# Altium footprint library ref-packages.PCBLIB: 1544 footprints (part 71 of 103) (continued)
## SQFP-R-07X10-60 [mil]
pads (60):
  rect 11.81x62.99 smd: 1(-167.32,-161.42) 2(-147.64,-161.42) 3(-127.95,-161.42) 4(-108.27,-161.42) 5(-88.58,-161.42) 6(-68.9,-161.42) 7(-49.21,-161.42) 8(-29.53,-161.42) 9(-9.84,-161.42) 10(9.84,-161.42) 11(29.53,-161.42) 12(49.21,-161.42) 13(68.9,-161.42) 14(88.58,-161.42) 15(108.27,-161.42) 16(127.95,-161.42) 17(147.64,-161.42) 18(167.32,-161.42) 31(167.32,161.42) 32(147.64,161.42) 33(127.95,161.42) 34(108.27,161.42) 35(88.58,161.42) 36(68.9,161.42) 37(49.21,161.42) 38(29.53,161.42) 39(9.84,161.42) 40(-9.84,161.42) 41(-29.53,161.42) 42(-49.21,161.42) 43(-68.9,161.42) 44(-88.58,161.42) 45(-108.27,161.42) 46(-127.95,161.42) 47(-147.64,161.42) 48(-167.32,161.42)
  rect 62.99x11.81 smd: 19(220.47,-108.27) 20(220.47,-88.58) 21(220.47,-68.9) 22(220.47,-49.21) 23(220.47,-29.53) 24(220.47,-9.84) 25(220.47,9.84) 26(220.47,29.53) 27(220.47,49.21) 28(220.47,68.9) 29(220.47,88.58) 30(220.47,108.27) 49(-220.47,108.27) 50(-220.47,88.58) 51(-220.47,68.9) 52(-220.47,49.21) 53(-220.47,29.53) 54(-220.47,9.84) 55(-220.47,-9.84) 56(-220.47,-29.53) 57(-220.47,-49.21) 58(-220.47,-68.9) 59(-220.47,-88.58) 60(-220.47,-108.27)
Top Overlay:
  circle w10: c-137.8,-78.74 r29.53
  lines w8: -179.92,-120.47 179.53,-120.47 179.53,120.47 -179.92,120.47 -179.92,-120.47
Mechanical 16:
  rectangle: -173.23,-181.1 -161.42,-135.83
  rectangle: 194.88,-114.17 240.16,-102.36
  rectangle: -153.54,-181.1 -141.73,-135.83
  rectangle: -133.86,-181.1 -122.05,-135.83
  rectangle: -114.17,-181.1 -102.36,-135.83
  rectangle: -94.49,-181.1 -82.68,-135.83
  rectangle: -74.8,-181.1 -62.99,-135.83
  rectangle: -55.12,-181.1 -43.31,-135.83
  rectangle: -35.43,-181.1 -23.62,-135.83
  rectangle: -15.75,-181.1 -3.94,-135.83
  rectangle: 3.94,-181.1 15.75,-135.83
  rectangle: 23.62,-181.1 35.43,-135.83
  rectangle: 43.31,-181.1 55.12,-135.83
  rectangle: 62.99,-181.1 74.8,-135.83
  rectangle: 82.68,-181.1 94.49,-135.83
  rectangle: 102.36,-181.1 114.17,-135.83
  rectangle: 122.05,-181.1 133.86,-135.83
  rectangle: 141.73,-181.1 153.54,-135.83
  rectangle: 161.42,-181.1 173.23,-135.83
  rectangle: 194.88,-94.49 240.16,-82.68
  rectangle: 194.88,-74.8 240.16,-62.99
  rectangle: 194.88,-55.12 240.16,-43.31
  rectangle: 194.88,-35.43 240.16,-23.62
  rectangle: 194.88,-15.75 240.16,-3.94
  rectangle: 194.88,3.94 240.16,15.75
  rectangle: 194.88,23.62 240.16,35.43
  rectangle: 194.88,43.31 240.16,55.12
  rectangle: 194.88,62.99 240.16,74.8
  rectangle: 194.88,82.68 240.16,94.49
  rectangle: 194.88,102.36 240.16,114.17
  rectangle: 161.42,135.83 173.23,181.1
  rectangle: 141.73,135.83 153.54,181.1
  rectangle: 122.05,135.83 133.86,181.1
  rectangle: 102.36,135.83 114.17,181.1
  rectangle: 82.68,135.83 94.49,181.1
  rectangle: 62.99,135.83 74.8,181.1
  rectangle: 43.31,135.83 55.12,181.1
  rectangle: 23.62,135.83 35.43,181.1
  rectangle: 3.94,135.83 15.75,181.1
  rectangle: -15.75,135.83 -3.94,181.1
  rectangle: -35.43,135.83 -23.62,181.1
  rectangle: -55.12,135.83 -43.31,181.1
  rectangle: -74.8,135.83 -62.99,181.1
  rectangle: -94.49,135.83 -82.68,181.1
  rectangle: -114.17,135.83 -102.36,181.1
  rectangle: -133.86,135.83 -122.05,181.1
  rectangle: -153.54,135.83 -141.73,181.1
  rectangle: -173.23,135.83 -161.42,181.1
  rectangle: -240.16,102.36 -194.88,114.17
  rectangle: -240.16,82.68 -194.88,94.49
  rectangle: -240.16,62.99 -194.88,74.8
  rectangle: -240.16,43.31 -194.88,55.12
  rectangle: -240.16,23.62 -194.88,35.43
  rectangle: -240.16,3.94 -194.88,15.75
  rectangle: -240.16,-15.75 -194.88,-3.94
  rectangle: -240.16,-35.43 -194.88,-23.62
  rectangle: -240.16,-55.12 -194.88,-43.31
  rectangle: -240.16,-74.8 -194.88,-62.99
  rectangle: -240.16,-94.49 -194.88,-82.68
  rectangle: -240.16,-114.17 -194.88,-102.36
  lines w8: -192.91,-133.86 192.91,-133.86 192.91,133.86 -192.91,133.86 -192.91,-133.86
Mechanical 27:
  lines w7.87: -271.65,-212.6 -271.65,212.6 271.65,212.6 271.65,-212.6 -271.65,-212.6

## SQFP-R-07X10-68 [mm]
pads (68):
  rect 0.25x1.6 smd: 1(-3.8,-4.1) 2(-3.4,-4.1) 3(-3,-4.1) 4(-2.6,-4.1) 5(-2.2,-4.1) 6(-1.8,-4.1) 7(-1.4,-4.1) 8(-1,-4.1) 9(-0.6,-4.1) 10(-0.2,-4.1) 11(0.2,-4.1) 12(0.6,-4.1) 13(1,-4.1) 14(1.4,-4.1) 15(1.8,-4.1) 16(2.2,-4.1) 17(2.6,-4.1) 18(3,-4.1) 19(3.4,-4.1) 20(3.8,-4.1) 35(3.8,4.1) 36(3.4,4.1) 37(3,4.1) 38(2.6,4.1) 39(2.2,4.1) 40(1.8,4.1) 41(1.4,4.1) 42(1,4.1) 43(0.6,4.1) 44(0.2,4.1) 45(-0.2,4.1) 46(-0.6,4.1) 47(-1,4.1) 48(-1.4,4.1) 49(-1.8,4.1) 50(-2.2,4.1) 51(-2.6,4.1) 52(-3,4.1) 53(-3.4,4.1) 54(-3.8,4.1)
  rect 1.6x0.25 smd: 21(5.6,-2.6) 22(5.6,-2.2) 23(5.6,-1.8) 24(5.6,-1.4) 25(5.6,-1) 26(5.6,-0.6) 27(5.6,-0.2) 28(5.6,0.2) 29(5.6,0.6) 30(5.6,1) 31(5.6,1.4) 32(5.6,1.8) 33(5.6,2.2) 34(5.6,2.6) 55(-5.6,2.6) 56(-5.6,2.2) 57(-5.6,1.8) 58(-5.6,1.4) 59(-5.6,1) 60(-5.6,0.6) 61(-5.6,0.2) 62(-5.6,-0.2) 63(-5.6,-0.6) 64(-5.6,-1) 65(-5.6,-1.4) 66(-5.6,-1.8) 67(-5.6,-2.2) 68(-5.6,-2.6)
Top Overlay:
  circle w0.254: c-3.5,-2 r0.75
  lines w0.203: -4.57,-3.06 4.56,-3.06 4.56,3.06 -4.57,3.06 -4.57,-3.06
Mechanical 16:
  rectangle: -3.91,-4.6 -3.69,-3.45
  rectangle: 4.95,-2.71 6.1,-2.49
  rectangle: -3.51,-4.6 -3.29,-3.45
  rectangle: -3.11,-4.6 -2.89,-3.45
  rectangle: -2.71,-4.6 -2.49,-3.45
  rectangle: -2.31,-4.6 -2.09,-3.45
  rectangle: -1.91,-4.6 -1.69,-3.45
  rectangle: -1.51,-4.6 -1.29,-3.45
  rectangle: -1.11,-4.6 -0.89,-3.45
  rectangle: -0.71,-4.6 -0.49,-3.45
  rectangle: -0.31,-4.6 -0.09,-3.45
  rectangle: 0.09,-4.6 0.31,-3.45
  rectangle: 0.49,-4.6 0.71,-3.45
  rectangle: 0.89,-4.6 1.11,-3.45
  rectangle: 1.29,-4.6 1.51,-3.45
  rectangle: 1.69,-4.6 1.91,-3.45
  rectangle: 2.09,-4.6 2.31,-3.45
  rectangle: 2.49,-4.6 2.71,-3.45
  rectangle: 2.89,-4.6 3.11,-3.45
  rectangle: 3.29,-4.6 3.51,-3.45
  rectangle: 3.69,-4.6 3.91,-3.45
  rectangle: 4.95,-2.31 6.1,-2.09
  rectangle: 4.95,-1.91 6.1,-1.69
  rectangle: 4.95,-1.51 6.1,-1.29
  rectangle: 4.95,-1.11 6.1,-0.89
  rectangle: 4.95,-0.71 6.1,-0.49
  rectangle: 4.95,-0.31 6.1,-0.09
  rectangle: 4.95,0.09 6.1,0.31
  rectangle: 4.95,0.49 6.1,0.71
  rectangle: 4.95,0.89 6.1,1.11
  rectangle: 4.95,1.29 6.1,1.51
  rectangle: 4.95,1.69 6.1,1.91
  rectangle: 4.95,2.09 6.1,2.31
  rectangle: 4.95,2.49 6.1,2.71
  rectangle: 3.69,3.45 3.91,4.6
  rectangle: 3.29,3.45 3.51,4.6
  rectangle: 2.89,3.45 3.11,4.6
  rectangle: 2.49,3.45 2.71,4.6
  rectangle: 2.09,3.45 2.31,4.6
  rectangle: 1.69,3.45 1.91,4.6
  rectangle: 1.29,3.45 1.51,4.6
  rectangle: 0.89,3.45 1.11,4.6
  rectangle: 0.49,3.45 0.71,4.6
  rectangle: 0.09,3.45 0.31,4.6
  rectangle: -0.31,3.45 -0.09,4.6
  rectangle: -0.71,3.45 -0.49,4.6
  rectangle: -1.11,3.45 -0.89,4.6
  rectangle: -1.51,3.45 -1.29,4.6
  rectangle: -1.91,3.45 -1.69,4.6
  rectangle: -2.31,3.45 -2.09,4.6
  rectangle: -2.71,3.45 -2.49,4.6
  rectangle: -3.11,3.45 -2.89,4.6
  rectangle: -3.51,3.45 -3.29,4.6
  rectangle: -3.91,3.45 -3.69,4.6
  rectangle: -6.1,2.49 -4.95,2.71
  rectangle: -6.1,2.09 -4.95,2.31
  rectangle: -6.1,1.69 -4.95,1.91
  rectangle: -6.1,1.29 -4.95,1.51
  rectangle: -6.1,0.89 -4.95,1.11
  rectangle: -6.1,0.49 -4.95,0.71
  rectangle: -6.1,0.09 -4.95,0.31
  rectangle: -6.1,-0.31 -4.95,-0.09
  rectangle: -6.1,-0.71 -4.95,-0.49
  rectangle: -6.1,-1.11 -4.95,-0.89
  rectangle: -6.1,-1.51 -4.95,-1.29
  rectangle: -6.1,-1.91 -4.95,-1.69
  rectangle: -6.1,-2.31 -4.95,-2.09
  rectangle: -6.1,-2.71 -4.95,-2.49
  lines w0.203: -4.9,-3.4 4.9,-3.4 4.9,3.4 -4.9,3.4 -4.9,-3.4
Mechanical 27:
  lines w0.2: -6.9,-5.4 -6.9,5.4 6.9,5.4 6.9,-5.4 -6.9,-5.4

## SQFP-R-07X10-76 [mm]
pads (76):
  rect 0.25x1.6 smd: 1(-4.2,-4.1) 2(-3.8,-4.1) 3(-3.4,-4.1) 4(-3,-4.1) 5(-2.6,-4.1) 6(-2.2,-4.1) 7(-1.8,-4.1) 8(-1.4,-4.1) 9(-1,-4.1) 10(-0.6,-4.1) 11(-0.2,-4.1) 12(0.2,-4.1) 13(0.6,-4.1) 14(1,-4.1) 15(1.4,-4.1) 16(1.8,-4.1) 17(2.2,-4.1) 18(2.6,-4.1) 19(3,-4.1) 20(3.4,-4.1) 21(3.8,-4.1) 22(4.2,-4.1) 39(4.2,4.1) 40(3.8,4.1) 41(3.4,4.1) 42(3,4.1) 43(2.6,4.1) 44(2.2,4.1) 45(1.8,4.1) 46(1.4,4.1) 47(1,4.1) 48(0.6,4.1) 49(0.2,4.1) 50(-0.2,4.1) 51(-0.6,4.1) 52(-1,4.1) 53(-1.4,4.1) 54(-1.8,4.1) 55(-2.2,4.1) 56(-2.6,4.1) 57(-3,4.1) 58(-3.4,4.1) 59(-3.8,4.1) 60(-4.2,4.1)
  rect 1.6x0.25 smd: 23(5.6,-3) 24(5.6,-2.6) 25(5.6,-2.2) 26(5.6,-1.8) 27(5.6,-1.4) 28(5.6,-1) 29(5.6,-0.6) 30(5.6,-0.2) 31(5.6,0.2) 32(5.6,0.6) 33(5.6,1) 34(5.6,1.4) 35(5.6,1.8) 36(5.6,2.2) 37(5.6,2.6) 38(5.6,3) 61(-5.6,3) 62(-5.6,2.6) 63(-5.6,2.2) 64(-5.6,1.8) 65(-5.6,1.4) 66(-5.6,1) 67(-5.6,0.6) 68(-5.6,0.2) 69(-5.6,-0.2) 70(-5.6,-0.6) 71(-5.6,-1) 72(-5.6,-1.4) 73(-5.6,-1.8) 74(-5.6,-2.2) 75(-5.6,-2.6) 76(-5.6,-3)
Top Overlay:
  circle w0.254: c-3.5,-2 r0.75
  lines w0.203: -4.57,-3.06 4.56,-3.06 4.56,3.06 -4.57,3.06 -4.57,-3.06
Mechanical 16:
  rectangle: -4.31,-4.6 -4.09,-3.45
  rectangle: 4.95,-3.11 6.1,-2.89
  rectangle: -3.91,-4.6 -3.69,-3.45
  rectangle: -3.51,-4.6 -3.29,-3.45
  rectangle: -3.11,-4.6 -2.89,-3.45
  rectangle: -2.71,-4.6 -2.49,-3.45
  rectangle: -2.31,-4.6 -2.09,-3.45
  rectangle: -1.91,-4.6 -1.69,-3.45
  rectangle: -1.51,-4.6 -1.29,-3.45
  rectangle: -1.11,-4.6 -0.89,-3.45
  rectangle: -0.71,-4.6 -0.49,-3.45
  rectangle: -0.31,-4.6 -0.09,-3.45
  rectangle: 0.09,-4.6 0.31,-3.45
  rectangle: 0.49,-4.6 0.71,-3.45
  rectangle: 0.89,-4.6 1.11,-3.45
  rectangle: 1.29,-4.6 1.51,-3.45
  rectangle: 1.69,-4.6 1.91,-3.45
  rectangle: 2.09,-4.6 2.31,-3.45
  rectangle: 2.49,-4.6 2.71,-3.45
  rectangle: 2.89,-4.6 3.11,-3.45
  rectangle: 3.29,-4.6 3.51,-3.45
  rectangle: 3.69,-4.6 3.91,-3.45
  rectangle: 4.09,-4.6 4.31,-3.45
  rectangle: 4.95,-2.71 6.1,-2.49
  rectangle: 4.95,-2.31 6.1,-2.09
  rectangle: 4.95,-1.91 6.1,-1.69
  rectangle: 4.95,-1.51 6.1,-1.29
  rectangle: 4.95,-1.11 6.1,-0.89
  rectangle: 4.95,-0.71 6.1,-0.49
  rectangle: 4.95,-0.31 6.1,-0.09
  rectangle: 4.95,0.09 6.1,0.31
  rectangle: 4.95,0.49 6.1,0.71
  rectangle: 4.95,0.89 6.1,1.11
  rectangle: 4.95,1.29 6.1,1.51
  rectangle: 4.95,1.69 6.1,1.91
  rectangle: 4.95,2.09 6.1,2.31
  rectangle: 4.95,2.49 6.1,2.71
  rectangle: 4.95,2.89 6.1,3.11
  rectangle: 4.09,3.45 4.31,4.6
  rectangle: 3.69,3.45 3.91,4.6
  rectangle: 3.29,3.45 3.51,4.6
  rectangle: 2.89,3.45 3.11,4.6
  rectangle: 2.49,3.45 2.71,4.6
  rectangle: 2.09,3.45 2.31,4.6
  rectangle: 1.69,3.45 1.91,4.6
  rectangle: 1.29,3.45 1.51,4.6
  rectangle: 0.89,3.45 1.11,4.6
  rectangle: 0.49,3.45 0.71,4.6
  rectangle: 0.09,3.45 0.31,4.6
  rectangle: -0.31,3.45 -0.09,4.6
  rectangle: -0.71,3.45 -0.49,4.6
  rectangle: -1.11,3.45 -0.89,4.6
  rectangle: -1.51,3.45 -1.29,4.6
  rectangle: -1.91,3.45 -1.69,4.6
  rectangle: -2.31,3.45 -2.09,4.6
  rectangle: -2.71,3.45 -2.49,4.6
  rectangle: -3.11,3.45 -2.89,4.6
  rectangle: -3.51,3.45 -3.29,4.6
  rectangle: -3.91,3.45 -3.69,4.6
  rectangle: -4.31,3.45 -4.09,4.6
  rectangle: -6.1,2.89 -4.95,3.11
  rectangle: -6.1,2.49 -4.95,2.71
  rectangle: -6.1,2.09 -4.95,2.31
  rectangle: -6.1,1.69 -4.95,1.91
  rectangle: -6.1,1.29 -4.95,1.51
  rectangle: -6.1,0.89 -4.95,1.11
  rectangle: -6.1,0.49 -4.95,0.71
  rectangle: -6.1,0.09 -4.95,0.31
  rectangle: -6.1,-0.31 -4.95,-0.09
  rectangle: -6.1,-0.71 -4.95,-0.49
  rectangle: -6.1,-1.11 -4.95,-0.89
  rectangle: -6.1,-1.51 -4.95,-1.29
  rectangle: -6.1,-1.91 -4.95,-1.69
  rectangle: -6.1,-2.31 -4.95,-2.09
  rectangle: -6.1,-2.71 -4.95,-2.49
  rectangle: -6.1,-3.11 -4.95,-2.89
  lines w0.203: -4.9,-3.4 4.9,-3.4 4.9,3.4 -4.9,3.4 -4.9,-3.4
Mechanical 27:
  lines w0.2: -6.9,-5.4 -6.9,5.4 6.9,5.4 6.9,-5.4 -6.9,-5.4

## SQFP-R-07X10-92 [mm]
pads (92):
  rect 0.17x1.6 smd: 1(-4.05,-4.1) 2(-3.75,-4.1) 3(-3.45,-4.1) 4(-3.15,-4.1) 5(-2.85,-4.1) 6(-2.55,-4.1) 7(-2.25,-4.1) 8(-1.95,-4.1) 9(-1.65,-4.1) 10(-1.35,-4.1) 11(-1.05,-4.1) 12(-0.75,-4.1) 13(-0.45,-4.1) 14(-0.15,-4.1) 15(0.15,-4.1) 16(0.45,-4.1) 17(0.75,-4.1) 18(1.05,-4.1) 19(1.35,-4.1) 20(1.65,-4.1) 21(1.95,-4.1) 22(2.25,-4.1) 23(2.55,-4.1) 24(2.85,-4.1) 25(3.15,-4.1) 26(3.45,-4.1) 27(3.75,-4.1) 28(4.05,-4.1) 47(4.05,4.1) 48(3.75,4.1) 49(3.45,4.1) 50(3.15,4.1) 51(2.85,4.1) 52(2.55,4.1) 53(2.25,4.1) 54(1.95,4.1) 55(1.65,4.1) 56(1.35,4.1) 57(1.05,4.1) 58(0.75,4.1) 59(0.45,4.1) 60(0.15,4.1) 61(-0.15,4.1) 62(-0.45,4.1) 63(-0.75,4.1) 64(-1.05,4.1) 65(-1.35,4.1) 66(-1.65,4.1) 67(-1.95,4.1) 68(-2.25,4.1) 69(-2.55,4.1) 70(-2.85,4.1) 71(-3.15,4.1) 72(-3.45,4.1) 73(-3.75,4.1) 74(-4.05,4.1)
  rect 1.6x0.17 smd: 29(5.6,-2.55) 30(5.6,-2.25) 31(5.6,-1.95) 32(5.6,-1.65) 33(5.6,-1.35) 34(5.6,-1.05) 35(5.6,-0.75) 36(5.6,-0.45) 37(5.6,-0.15) 38(5.6,0.15) 39(5.6,0.45) 40(5.6,0.75) 41(5.6,1.05) 42(5.6,1.35) 43(5.6,1.65) 44(5.6,1.95) 45(5.6,2.25) 46(5.6,2.55) 75(-5.6,2.55) 76(-5.6,2.25) 77(-5.6,1.95) 78(-5.6,1.65) 79(-5.6,1.35) 80(-5.6,1.05) 81(-5.6,0.75) 82(-5.6,0.45) 83(-5.6,0.15) 84(-5.6,-0.15) 85(-5.6,-0.45) 86(-5.6,-0.75) 87(-5.6,-1.05) 88(-5.6,-1.35) 89(-5.6,-1.65) 90(-5.6,-1.95) 91(-5.6,-2.25) 92(-5.6,-2.55)
Top Overlay:
  circle w0.254: c-3.5,-2 r0.75
  lines w0.203: -4.57,-3.06 4.56,-3.06 4.56,3.06 -4.57,3.06 -4.57,-3.06
Mechanical 16:
  rectangle: -4.12,-4.6 -3.98,-3.45
  rectangle: 4.95,-2.62 6.1,-2.48
  rectangle: -3.82,-4.6 -3.68,-3.45
  rectangle: -3.52,-4.6 -3.38,-3.45
  rectangle: -3.22,-4.6 -3.08,-3.45
  rectangle: -2.92,-4.6 -2.78,-3.45
  rectangle: -2.62,-4.6 -2.48,-3.45
  rectangle: -2.32,-4.6 -2.18,-3.45
  rectangle: -2.02,-4.6 -1.88,-3.45
  rectangle: -1.72,-4.6 -1.58,-3.45
  rectangle: -1.42,-4.6 -1.28,-3.45
  rectangle: -1.12,-4.6 -0.98,-3.45
  rectangle: -0.82,-4.6 -0.68,-3.45
  rectangle: -0.52,-4.6 -0.38,-3.45
  rectangle: -0.22,-4.6 -0.08,-3.45
  rectangle: 0.08,-4.6 0.22,-3.45
  rectangle: 0.38,-4.6 0.52,-3.45
  rectangle: 0.68,-4.6 0.82,-3.45
  rectangle: 0.98,-4.6 1.12,-3.45
  rectangle: 1.28,-4.6 1.42,-3.45
  rectangle: 1.58,-4.6 1.72,-3.45
  rectangle: 1.88,-4.6 2.02,-3.45
  rectangle: 2.18,-4.6 2.32,-3.45
  rectangle: 2.48,-4.6 2.62,-3.45
  rectangle: 2.78,-4.6 2.92,-3.45
  rectangle: 3.08,-4.6 3.22,-3.45
  rectangle: 3.38,-4.6 3.52,-3.45
  rectangle: 3.68,-4.6 3.82,-3.45
  rectangle: 3.98,-4.6 4.12,-3.45
  rectangle: 4.95,-2.32 6.1,-2.18
  rectangle: 4.95,-2.02 6.1,-1.88
  rectangle: 4.95,-1.72 6.1,-1.58
  rectangle: 4.95,-1.42 6.1,-1.28
  rectangle: 4.95,-1.12 6.1,-0.98
  rectangle: 4.95,-0.82 6.1,-0.68
  rectangle: 4.95,-0.52 6.1,-0.38
  rectangle: 4.95,-0.22 6.1,-0.08
  rectangle: 4.95,0.08 6.1,0.22
  rectangle: 4.95,0.38 6.1,0.52
  rectangle: 4.95,0.68 6.1,0.82
  rectangle: 4.95,0.98 6.1,1.12
  rectangle: 4.95,1.28 6.1,1.42
  rectangle: 4.95,1.58 6.1,1.72
  rectangle: 4.95,1.88 6.1,2.02
  rectangle: 4.95,2.18 6.1,2.32
  rectangle: 4.95,2.48 6.1,2.62
  rectangle: 3.98,3.45 4.12,4.6
  rectangle: 3.68,3.45 3.82,4.6
  rectangle: 3.38,3.45 3.52,4.6
  rectangle: 3.08,3.45 3.22,4.6
  rectangle: 2.78,3.45 2.92,4.6
  rectangle: 2.48,3.45 2.62,4.6
  rectangle: 2.18,3.45 2.32,4.6
  rectangle: 1.88,3.45 2.02,4.6
  rectangle: 1.58,3.45 1.72,4.6
  rectangle: 1.28,3.45 1.42,4.6
  rectangle: 0.98,3.45 1.12,4.6
  rectangle: 0.68,3.45 0.82,4.6
  rectangle: 0.38,3.45 0.52,4.6
  rectangle: 0.08,3.45 0.22,4.6
  rectangle: -0.22,3.45 -0.08,4.6
  rectangle: -0.52,3.45 -0.38,4.6
  rectangle: -0.82,3.45 -0.68,4.6
  rectangle: -1.12,3.45 -0.98,4.6
  rectangle: -1.42,3.45 -1.28,4.6
  rectangle: -1.72,3.45 -1.58,4.6
  rectangle: -2.02,3.45 -1.88,4.6
  rectangle: -2.32,3.45 -2.18,4.6
  rectangle: -2.62,3.45 -2.48,4.6
  rectangle: -2.92,3.45 -2.78,4.6
  rectangle: -3.22,3.45 -3.08,4.6
  rectangle: -3.52,3.45 -3.38,4.6
  rectangle: -3.82,3.45 -3.68,4.6
  rectangle: -4.12,3.45 -3.98,4.6
  rectangle: -6.1,2.48 -4.95,2.62
  rectangle: -6.1,2.18 -4.95,2.32
  rectangle: -6.1,1.88 -4.95,2.02
  rectangle: -6.1,1.58 -4.95,1.72
  rectangle: -6.1,1.28 -4.95,1.42
  rectangle: -6.1,0.98 -4.95,1.12
  rectangle: -6.1,0.68 -4.95,0.82
  rectangle: -6.1,0.38 -4.95,0.52
  rectangle: -6.1,0.08 -4.95,0.22
  rectangle: -6.1,-0.22 -4.95,-0.08
  rectangle: -6.1,-0.52 -4.95,-0.38
  rectangle: -6.1,-0.82 -4.95,-0.68
  rectangle: -6.1,-1.12 -4.95,-0.98
  rectangle: -6.1,-1.42 -4.95,-1.28
  rectangle: -6.1,-1.72 -4.95,-1.58
  rectangle: -6.1,-2.02 -4.95,-1.88
  rectangle: -6.1,-2.32 -4.95,-2.18
  rectangle: -6.1,-2.62 -4.95,-2.48
  lines w0.203: -4.9,-3.4 4.9,-3.4 4.9,3.4 -4.9,3.4 -4.9,-3.4
Mechanical 27:
  lines w0.2: -6.9,-5.4 -6.9,5.4 6.9,5.4 6.9,-5.4 -6.9,-5.4

## SQFP-R-07X10-100 [mm]
pads (100):
  rect 0.17x1.6 smd: 1(-4.35,-4.1) 2(-4.05,-4.1) 3(-3.75,-4.1) 4(-3.45,-4.1) 5(-3.15,-4.1) 6(-2.85,-4.1) 7(-2.55,-4.1) 8(-2.25,-4.1) 9(-1.95,-4.1) 10(-1.65,-4.1) 11(-1.35,-4.1) 12(-1.05,-4.1) 13(-0.75,-4.1) 14(-0.45,-4.1) 15(-0.15,-4.1) 16(0.15,-4.1) 17(0.45,-4.1) 18(0.75,-4.1) 19(1.05,-4.1) 20(1.35,-4.1) 21(1.65,-4.1) 22(1.95,-4.1) 23(2.25,-4.1) 24(2.55,-4.1) 25(2.85,-4.1) 26(3.15,-4.1) 27(3.45,-4.1) 28(3.75,-4.1) 29(4.05,-4.1) 30(4.35,-4.1) 51(4.35,4.1) 52(4.05,4.1) 53(3.75,4.1) 54(3.45,4.1) 55(3.15,4.1) 56(2.85,4.1) 57(2.55,4.1) 58(2.25,4.1) 59(1.95,4.1) 60(1.65,4.1) 61(1.35,4.1) 62(1.05,4.1) 63(0.75,4.1) 64(0.45,4.1) 65(0.15,4.1) 66(-0.15,4.1) 67(-0.45,4.1) 68(-0.75,4.1) 69(-1.05,4.1) 70(-1.35,4.1) 71(-1.65,4.1) 72(-1.95,4.1) 73(-2.25,4.1) 74(-2.55,4.1) 75(-2.85,4.1) 76(-3.15,4.1) 77(-3.45,4.1) 78(-3.75,4.1) 79(-4.05,4.1) 80(-4.35,4.1)
  rect 1.6x0.17 smd: 31(5.6,-2.85) 32(5.6,-2.55) 33(5.6,-2.25) 34(5.6,-1.95) 35(5.6,-1.65) 36(5.6,-1.35) 37(5.6,-1.05) 38(5.6,-0.75) 39(5.6,-0.45) 40(5.6,-0.15) 41(5.6,0.15) 42(5.6,0.45) 43(5.6,0.75) 44(5.6,1.05) 45(5.6,1.35) 46(5.6,1.65) 47(5.6,1.95) 48(5.6,2.25) 49(5.6,2.55) 50(5.6,2.85) 81(-5.6,2.85) 82(-5.6,2.55) 83(-5.6,2.25) 84(-5.6,1.95) 85(-5.6,1.65) 86(-5.6,1.35) 87(-5.6,1.05) 88(-5.6,0.75) 89(-5.6,0.45) 90(-5.6,0.15) 91(-5.6,-0.15) 92(-5.6,-0.45) 93(-5.6,-0.75) 94(-5.6,-1.05) 95(-5.6,-1.35) 96(-5.6,-1.65) 97(-5.6,-1.95) 98(-5.6,-2.25) 99(-5.6,-2.55) 100(-5.6,-2.85)
Top Overlay:
  circle w0.254: c-3.5,-2 r0.75
  lines w0.203: -4.57,-3.06 4.56,-3.06 4.56,3.06 -4.57,3.06 -4.57,-3.06
Mechanical 16:
  rectangle: -4.42,-4.6 -4.28,-3.45
  rectangle: 4.95,-2.92 6.1,-2.78
  rectangle: -4.12,-4.6 -3.98,-3.45
  rectangle: -3.82,-4.6 -3.68,-3.45
  rectangle: -3.52,-4.6 -3.38,-3.45
  rectangle: -3.22,-4.6 -3.08,-3.45
  rectangle: -2.92,-4.6 -2.78,-3.45
  rectangle: -2.62,-4.6 -2.48,-3.45
  rectangle: -2.32,-4.6 -2.18,-3.45
  rectangle: -2.02,-4.6 -1.88,-3.45
  rectangle: -1.72,-4.6 -1.58,-3.45
  rectangle: -1.42,-4.6 -1.28,-3.45
  rectangle: -1.12,-4.6 -0.98,-3.45
  rectangle: -0.82,-4.6 -0.68,-3.45
  rectangle: -0.52,-4.6 -0.38,-3.45
  rectangle: -0.22,-4.6 -0.08,-3.45
  rectangle: 0.08,-4.6 0.22,-3.45
  rectangle: 0.38,-4.6 0.52,-3.45
  rectangle: 0.68,-4.6 0.82,-3.45
  rectangle: 0.98,-4.6 1.12,-3.45
  rectangle: 1.28,-4.6 1.42,-3.45
  rectangle: 1.58,-4.6 1.72,-3.45
  rectangle: 1.88,-4.6 2.02,-3.45
  rectangle: 2.18,-4.6 2.32,-3.45
  rectangle: 2.48,-4.6 2.62,-3.45
  rectangle: 2.78,-4.6 2.92,-3.45
  rectangle: 3.08,-4.6 3.22,-3.45
  rectangle: 3.38,-4.6 3.52,-3.45
  rectangle: 3.68,-4.6 3.82,-3.45
  rectangle: 3.98,-4.6 4.12,-3.45
  rectangle: 4.28,-4.6 4.42,-3.45
  rectangle: 4.95,-2.62 6.1,-2.48
  rectangle: 4.95,-2.32 6.1,-2.18
  rectangle: 4.95,-2.02 6.1,-1.88
  rectangle: 4.95,-1.72 6.1,-1.58
  rectangle: 4.95,-1.42 6.1,-1.28
  rectangle: 4.95,-1.12 6.1,-0.98
  rectangle: 4.95,-0.82 6.1,-0.68
  rectangle: 4.95,-0.52 6.1,-0.38
  rectangle: 4.95,-0.22 6.1,-0.08
  rectangle: 4.95,0.08 6.1,0.22
  rectangle: 4.95,0.38 6.1,0.52
  rectangle: 4.95,0.68 6.1,0.82
  rectangle: 4.95,0.98 6.1,1.12
  rectangle: 4.95,1.28 6.1,1.42
  rectangle: 4.95,1.58 6.1,1.72
  rectangle: 4.95,1.88 6.1,2.02
  rectangle: 4.95,2.18 6.1,2.32
  rectangle: 4.95,2.48 6.1,2.62
  rectangle: 4.95,2.78 6.1,2.92
  rectangle: 4.28,3.45 4.42,4.6
  rectangle: 3.98,3.45 4.12,4.6
  rectangle: 3.68,3.45 3.82,4.6
  rectangle: 3.38,3.45 3.52,4.6
  rectangle: 3.08,3.45 3.22,4.6
  rectangle: 2.78,3.45 2.92,4.6
  rectangle: 2.48,3.45 2.62,4.6
  rectangle: 2.18,3.45 2.32,4.6
  rectangle: 1.88,3.45 2.02,4.6
  rectangle: 1.58,3.45 1.72,4.6
  rectangle: 1.28,3.45 1.42,4.6
  rectangle: 0.98,3.45 1.12,4.6
  rectangle: 0.68,3.45 0.82,4.6
  rectangle: 0.38,3.45 0.52,4.6
  rectangle: 0.08,3.45 0.22,4.6
  rectangle: -0.22,3.45 -0.08,4.6
  rectangle: -0.52,3.45 -0.38,4.6
  rectangle: -0.82,3.45 -0.68,4.6
  rectangle: -1.12,3.45 -0.98,4.6
  rectangle: -1.42,3.45 -1.28,4.6
  rectangle: -1.72,3.45 -1.58,4.6
  rectangle: -2.02,3.45 -1.88,4.6
  rectangle: -2.32,3.45 -2.18,4.6
  rectangle: -2.62,3.45 -2.48,4.6
  rectangle: -2.92,3.45 -2.78,4.6
  rectangle: -3.22,3.45 -3.08,4.6
  rectangle: -3.52,3.45 -3.38,4.6
  rectangle: -3.82,3.45 -3.68,4.6
  rectangle: -4.12,3.45 -3.98,4.6
  rectangle: -4.42,3.45 -4.28,4.6
  rectangle: -6.1,2.78 -4.95,2.92
  rectangle: -6.1,2.48 -4.95,2.62
  rectangle: -6.1,2.18 -4.95,2.32
  rectangle: -6.1,1.88 -4.95,2.02
  rectangle: -6.1,1.58 -4.95,1.72
  rectangle: -6.1,1.28 -4.95,1.42
  rectangle: -6.1,0.98 -4.95,1.12
  rectangle: -6.1,0.68 -4.95,0.82
  rectangle: -6.1,0.38 -4.95,0.52
  rectangle: -6.1,0.08 -4.95,0.22
  rectangle: -6.1,-0.22 -4.95,-0.08
  rectangle: -6.1,-0.52 -4.95,-0.38
  rectangle: -6.1,-0.82 -4.95,-0.68
  rectangle: -6.1,-1.12 -4.95,-0.98
  rectangle: -6.1,-1.42 -4.95,-1.28
  rectangle: -6.1,-1.72 -4.95,-1.58
  rectangle: -6.1,-2.02 -4.95,-1.88
  rectangle: -6.1,-2.32 -4.95,-2.18
  rectangle: -6.1,-2.62 -4.95,-2.48
  rectangle: -6.1,-2.92 -4.95,-2.78
  lines w0.203: -4.9,-3.4 4.9,-3.4 4.9,3.4 -4.9,3.4 -4.9,-3.4
Mechanical 27:
  lines w0.2: -6.9,-5.4 -6.9,5.4 6.9,5.4 6.9,-5.4 -6.9,-5.4

## SQFP-R-10X14-80 [mil]
pads (80):
  rect 11.81x62.99 smd: 1(-226.38,-220.47) 2(-206.69,-220.47) 3(-187.01,-220.47) 4(-167.32,-220.47) 5(-147.64,-220.47) 6(-127.95,-220.47) 7(-108.27,-220.47) 8(-88.58,-220.47) 9(-68.9,-220.47) 10(-49.21,-220.47) 11(-29.53,-220.47) 12(-9.84,-220.47) 13(9.84,-220.47) 14(29.53,-220.47) 15(49.21,-220.47) 16(68.9,-220.47) 17(88.58,-220.47) 18(108.27,-220.47) 19(127.95,-220.47) 20(147.64,-220.47) 21(167.32,-220.47) 22(187.01,-220.47) 23(206.69,-220.47) 24(226.38,-220.47) 41(226.38,220.47) 42(206.69,220.47) 43(187.01,220.47) 44(167.32,220.47) 45(147.64,220.47) 46(127.95,220.47) 47(108.27,220.47) 48(88.58,220.47) 49(68.9,220.47) 50(49.21,220.47) 51(29.53,220.47) 52(9.84,220.47) 53(-9.84,220.47) 54(-29.53,220.47) 55(-49.21,220.47) 56(-68.9,220.47) 57(-88.58,220.47) 58(-108.27,220.47) 59(-127.95,220.47) 60(-147.64,220.47) 61(-167.32,220.47) 62(-187.01,220.47) 63(-206.69,220.47) 64(-226.38,220.47)
  rect 62.99x11.81 smd: 25(299.21,-147.64) 26(299.21,-127.95) 27(299.21,-108.27) 28(299.21,-88.58) 29(299.21,-68.9) 30(299.21,-49.21) 31(299.21,-29.53) 32(299.21,-9.84) 33(299.21,9.84) 34(299.21,29.53) 35(299.21,49.21) 36(299.21,68.9) 37(299.21,88.58) 38(299.21,108.27) 39(299.21,127.95) 40(299.21,147.64) 65(-299.21,147.64) 66(-299.21,127.95) 67(-299.21,108.27) 68(-299.21,88.58) 69(-299.21,68.9) 70(-299.21,49.21) 71(-299.21,29.53) 72(-299.21,9.84) 73(-299.21,-9.84) 74(-299.21,-29.53) 75(-299.21,-49.21) 76(-299.21,-68.9) 77(-299.21,-88.58) 78(-299.21,-108.27) 79(-299.21,-127.95) 80(-299.21,-147.64)
Top Overlay:
  circle w10: c-216.54,-137.8 r29.53
  lines w8: -258.66,-179.53 258.27,-179.53 258.27,179.53 -258.66,179.53 -258.66,-179.53
Mechanical 16:
  rectangle: -232.28,-240.16 -220.47,-194.88
  rectangle: 273.62,-153.54 318.9,-141.73
  rectangle: -212.6,-240.16 -200.79,-194.88
  rectangle: -192.91,-240.16 -181.1,-194.88
  rectangle: -173.23,-240.16 -161.42,-194.88
  rectangle: -153.54,-240.16 -141.73,-194.88
  rectangle: -133.86,-240.16 -122.05,-194.88
  rectangle: -114.17,-240.16 -102.36,-194.88
  rectangle: -94.49,-240.16 -82.68,-194.88
  rectangle: -74.8,-240.16 -62.99,-194.88
  rectangle: -55.12,-240.16 -43.31,-194.88
  rectangle: -35.43,-240.16 -23.62,-194.88
  rectangle: -15.75,-240.16 -3.94,-194.88
  rectangle: 3.94,-240.16 15.75,-194.88
  rectangle: 23.62,-240.16 35.43,-194.88
  rectangle: 43.31,-240.16 55.12,-194.88
  rectangle: 62.99,-240.16 74.8,-194.88
  rectangle: 82.68,-240.16 94.49,-194.88
  rectangle: 102.36,-240.16 114.17,-194.88
  rectangle: 122.05,-240.16 133.86,-194.88
  rectangle: 141.73,-240.16 153.54,-194.88
  rectangle: 161.42,-240.16 173.23,-194.88
  rectangle: 181.1,-240.16 192.91,-194.88
  rectangle: 200.79,-240.16 212.6,-194.88
  rectangle: 220.47,-240.16 232.28,-194.88
  rectangle: 273.62,-133.86 318.9,-122.05
  rectangle: 273.62,-114.17 318.9,-102.36
  rectangle: 273.62,-94.49 318.9,-82.68
  rectangle: 273.62,-74.8 318.9,-62.99
  rectangle: 273.62,-55.12 318.9,-43.31
  rectangle: 273.62,-35.43 318.9,-23.62
  rectangle: 273.62,-15.75 318.9,-3.94
  rectangle: 273.62,3.94 318.9,15.75
  rectangle: 273.62,23.62 318.9,35.43
  rectangle: 273.62,43.31 318.9,55.12
  rectangle: 273.62,62.99 318.9,74.8
  rectangle: 273.62,82.68 318.9,94.49
  rectangle: 273.62,102.36 318.9,114.17
  rectangle: 273.62,122.05 318.9,133.86
  rectangle: 273.62,141.73 318.9,153.54
  rectangle: 220.47,194.88 232.28,240.16
  rectangle: 200.79,194.88 212.6,240.16
  rectangle: 181.1,194.88 192.91,240.16
  rectangle: 161.42,194.88 173.23,240.16
  rectangle: 141.73,194.88 153.54,240.16
  rectangle: 122.05,194.88 133.86,240.16
  rectangle: 102.36,194.88 114.17,240.16
  rectangle: 82.68,194.88 94.49,240.16
  rectangle: 62.99,194.88 74.8,240.16
  rectangle: 43.31,194.88 55.12,240.16
  rectangle: 23.62,194.88 35.43,240.16
  rectangle: 3.94,194.88 15.75,240.16
  rectangle: -15.75,194.88 -3.94,240.16
  rectangle: -35.43,194.88 -23.62,240.16
  rectangle: -55.12,194.88 -43.31,240.16
  rectangle: -74.8,194.88 -62.99,240.16
  rectangle: -94.49,194.88 -82.68,240.16
  rectangle: -114.17,194.88 -102.36,240.16
  rectangle: -133.86,194.88 -122.05,240.16
  rectangle: -153.54,194.88 -141.73,240.16
  rectangle: -173.23,194.88 -161.42,240.16
  rectangle: -192.91,194.88 -181.1,240.16
  rectangle: -212.6,194.88 -200.79,240.16
  rectangle: -232.28,194.88 -220.47,240.16
  rectangle: -318.9,141.73 -273.62,153.54
  rectangle: -318.9,122.05 -273.62,133.86
  rectangle: -318.9,102.36 -273.62,114.17
  rectangle: -318.9,82.68 -273.62,94.49
  rectangle: -318.9,62.99 -273.62,74.8
  rectangle: -318.9,43.31 -273.62,55.12
  rectangle: -318.9,23.62 -273.62,35.43
  rectangle: -318.9,3.94 -273.62,15.75
  rectangle: -318.9,-15.75 -273.62,-3.94
  rectangle: -318.9,-35.43 -273.62,-23.62
  rectangle: -318.9,-55.12 -273.62,-43.31
  rectangle: -318.9,-74.8 -273.62,-62.99
  rectangle: -318.9,-94.49 -273.62,-82.68
  rectangle: -318.9,-114.17 -273.62,-102.36
  rectangle: -318.9,-133.86 -273.62,-122.05
  rectangle: -318.9,-153.54 -273.62,-141.73
  lines w8: -271.65,-192.91 271.65,-192.91 271.65,192.91 -271.65,192.91 -271.65,-192.91
Mechanical 27:
  lines w7.87: -350.39,-271.65 -350.39,271.65 350.39,271.65 350.39,-271.65 -350.39,-271.65